# Altium footprint library PcbLib1.PcbLib: 120 footprints (part 6 of 8)
Each footprint in its own frame and in the unit in brackets; x right, y up, seen from the top. Pads: shape width x height; smd on the part's side, far side on the other; paste and mask are expansions set on the pad; w line width, h text height; cw(c..) or ccw(c..) is an arc to the next point about the centre after c.
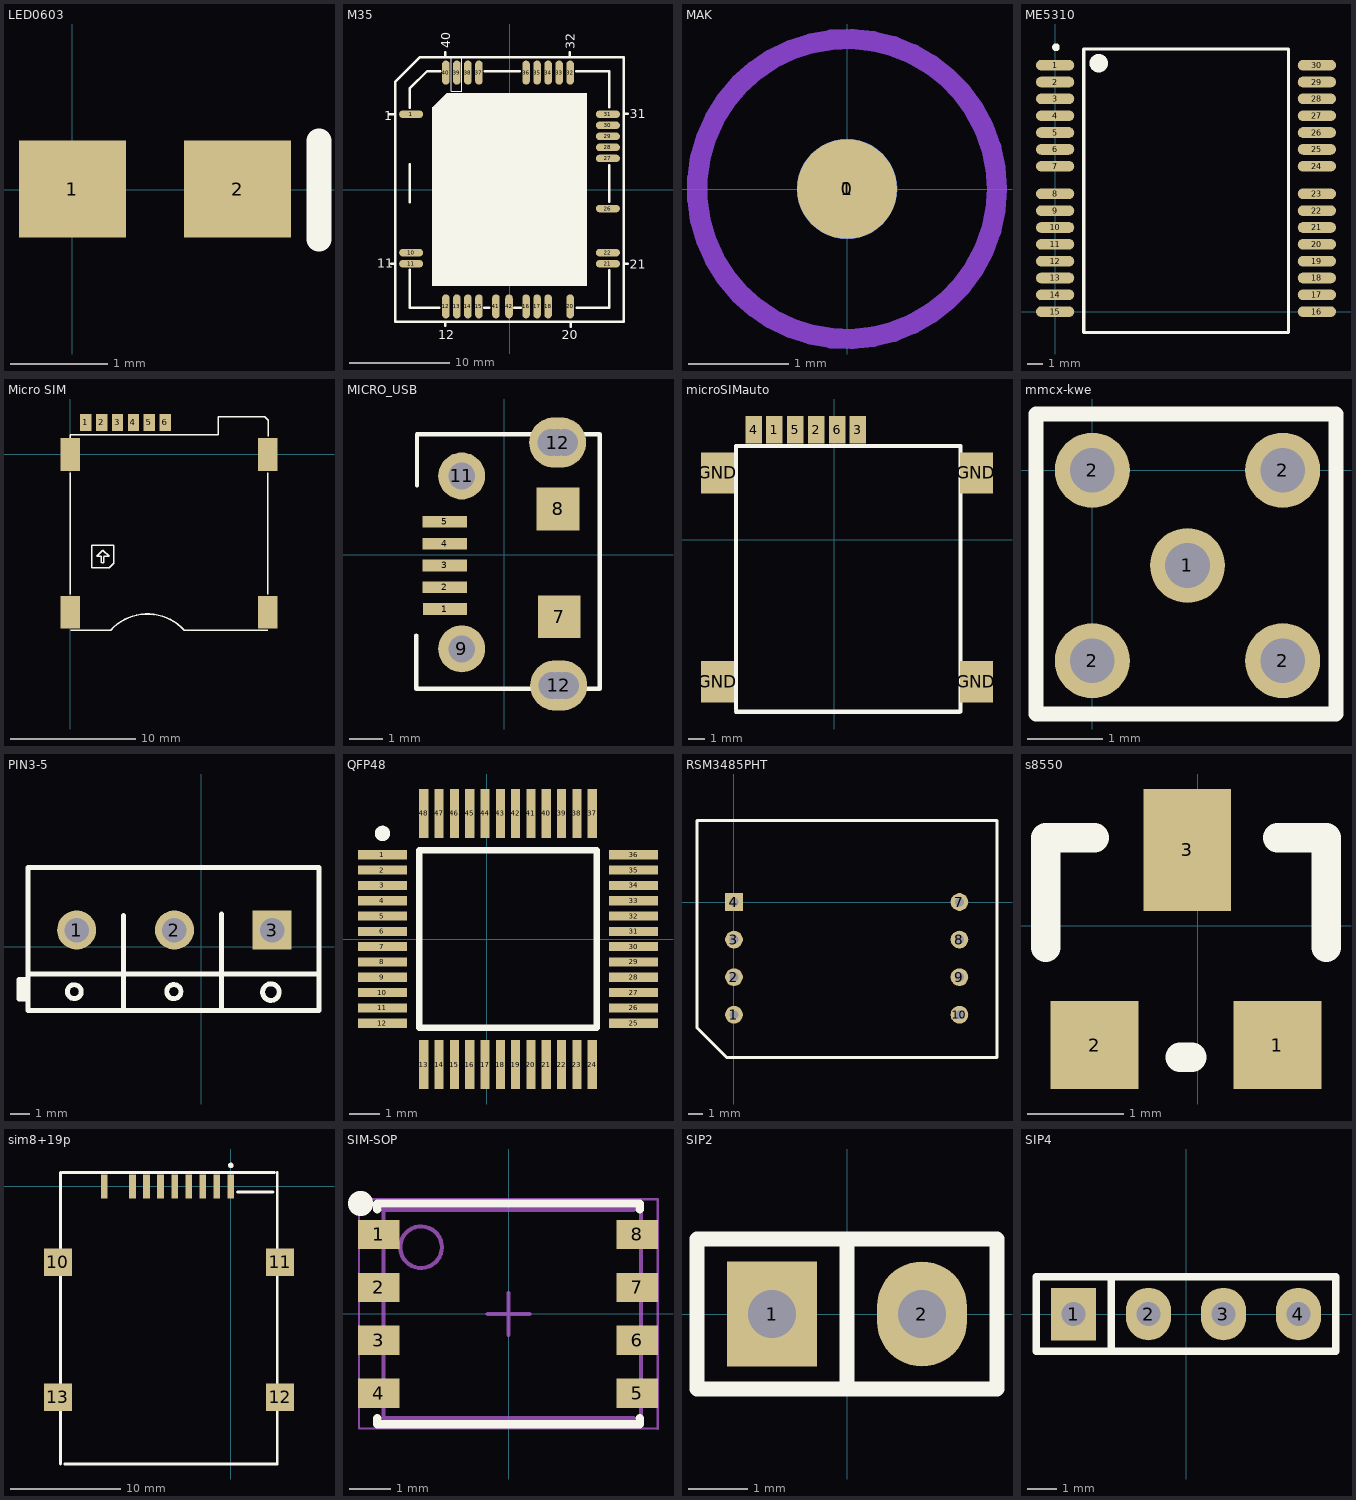
[diagram p5: the footprints below, top view; thin cyan lines are the x and y axes]

## LED0603 [mm]
height 2
pads (2):
  rect 1.1x1 smd: 1(0.001,0.01) 2(1.701,0.01)
Top Overlay:
  lines w0.254: 2.54,-0.508 2.54,0.508

## M35 [mm]
height 60
pads (43):
  oval 2.4x0.75 smd: 1(-9.8,7.5) 10(-9.8,-6.3) 11(-9.8,-7.4) 21(9.8,-7.4) 22(9.8,-6.3) 26(9.8,-1.9) 27(9.8,3.1) 28(9.8,4.2) 29(9.8,5.3) 30(9.8,6.4) 31(9.8,7.5)
  round 0 smd: 2(-9.8,6.4) 3(-9.8,5.3) 4(-9.8,4.2) 5(-9.8,3.1) 6(-9.8,-1.9) 7(-9.8,-3) 8(-9.8,-4.1) 9(-9.8,-5.2) 19(4.95,-11.65) 20(6.05,-11.65) 23(9.8,-5.2) 24(9.8,-4.1) 25(9.8,-3)
  oval 0.75x2.4 smd: 12(-6.35,-11.65) 13(-5.25,-11.65) 14(-4.15,-11.65) 15(-3.05,-11.65) 16(1.65,-11.65) 17(2.75,-11.65) 18(3.85,-11.65) 20(6.05,-11.65) 32(6.05,11.65) 33(4.95,11.65) 34(3.85,11.65) 35(2.75,11.65) 36(1.65,11.65) 37(-3.05,11.65) 38(-4.15,11.65) 39(-5.25,11.65) 40(-6.35,11.65) 41(-1.35,-11.65) 42(-0.05,-11.65)
Top Overlay:
  rectangle: -6.3,-9.6 7.7,9.6
  region: -6.291,6.775 -4.884,8.182 -6.299,9.596 -7.706,8.189
  rectangle: -7.7,-9.6 -6.2,8.2
  lines w0.1: -5.8,9.8 -4.75,9.8 -4.75,13.2 -5.8,13.2 -5.8,9.8
  lines w0.25: -12,7.5 -11.45,7.5
  lines w0.254: -11.8,-7.4 -11.45,-7.4 ; -11.4,-12.9 -11.4,10.7 -8.9,13.2 -3.1,13.2 ; -11.4,-12.7 -11.4,-13.2 11.4,-13.2 11.4,13.2 -3.3,13.2 ; -9.95,-8.025 -9.95,-11.8 -7,-11.8 ; -9.95,-1.275 -9.95,2.5 ; -9.95,8.15 -9.95,10.05 -8.2,11.8 ; -8.175,11.8 -6.9,11.8 ; -6.4,-13.6 -6.4,-13.2 ; -6.4,13.3 -6.4,13.7 ; -2.5,-11.8 -2,-11.8 ; -2.45,11.8 1,11.8 ; 0.5,-11.8 1.1,-11.8 ; 6,13.3 6,13.7 ; 6.1,-13.7 6.1,-13.25 ; 6.65,11.8 9.95,11.8 9.95,8.2 ; 6.7,-11.8 9.95,-11.8 9.95,-8.075 ; 9.95,-1.225 9.95,2.425 ; 11.472,7.536 11.772,7.536 ; 11.55,-7.4 11.8,-7.4
  text "20" at 5.2,-14.9 h0.9
  text "40" at -5.9,14.1 h0.9
  text "31" at 12,7.1 h0.9
  text "32" at 6.5,14 h0.9
  text "21" at 12,-7.9 h0.9
  text "1" at -12.5,6.9 h0.9
  text "11" at -13.2,-7.8 h0.9
  text "12" at -7.1,-14.9 h0.9

## MAK [mm]
height 0.1
pads (2):
  round 1 smd: 0(0,0)
  round 1 smd far side: 1(0,0)
Top Layer keep-out:
  circle w0.203: c0,0 r1.5
Bottom Layer keep-out:
  circle w0.203: c0,0 r1.5

## ME5310 [mm]
pads (30):
  oval 2.5x0.7 smd: 1(0,16.1) 2(0,15) 3(0,13.9) 4(0,12.8) 5(0,11.7) 6(0,10.6) 7(0,9.5) 8(0,7.7) 9(0,6.6) 10(0,5.5) 11(0,4.4) 12(0,3.3) 13(0,2.2) 14(0,1.1) 15(0,0) 16(17.1,0) 17(17.1,1.1) 18(17.1,2.2) 19(17.1,3.3) 20(17.1,4.4) 21(17.1,5.5) 22(17.1,6.6) 23(17.1,7.7) 24(17.1,9.5) 25(17.1,10.6) 26(17.1,11.7) 27(17.1,12.8) 28(17.1,13.9) 29(17.1,15) 30(17.1,16.1)
Top Overlay:
  circle w0.6: c2.845,16.231 r0.3
  circle w0.25: c0.051,17.272 r0.125
  lines w0.2: 1.87,-1.372 15.24,-1.372 15.24,17.17 1.87,17.17 1.87,-1.372

## Micro SIM [mm] "6P 自弹式"
pads (10):
  rect 0.9x1.34 smd: 1(1.24,2.565) 2(2.51,2.565) 3(3.78,2.565) 4(5.05,2.565) 5(6.32,2.565) 6(7.59,2.565)
  rect 1.56x2.61 smd: ""(0,-12.63) ""(0,0) ""(15.78,-12.63) ""(15.78,0)
Top Overlay:
  lines w0.1: 0,-11.176 0,-1.448 ; 0,1.346 0,1.575 1.723,1.575 11.832,1.575 11.832,2.769 11.832,2.993 11.857,3.018 15.54,3.018 15.82,2.739 15.82,2.515 15.82,1.448 ; 0.046,-14.064 3.225,-14.064 ; 2.095,-8.141 2.591,-7.645 3.099,-8.153 2.692,-8.153 ; 2.108,-8.153 2.489,-8.153 2.489,-8.661 ; 2.515,-8.661 2.692,-8.661 2.692,-8.179 ; 3.454,-8.585 3.454,-7.239 1.727,-7.239 1.727,-9.068 3.099,-9.068 3.454,-8.712 3.454,-8.357 ; 9.113,-14.046 15.799,-14.046 ; 15.799,-11.176 15.799,-1.473
  lines w0.14: 3.225,-14.041 cw(c6.167,-16.751) 9.113,-14.046

## MICRO_USB [mm]
pads (11):
  rect 1.32x0.35 smd: 1(-1.772,-1.627) 2(-1.781,-0.977) 3(-1.781,-0.327) 4(-1.781,0.323) 5(-1.781,0.973)
  rect 1.27x1.27 smd: 7(1.631,-1.855) 8(1.598,1.358)
  round 1.4 hole 0.8: 9(-1.273,-2.812) 11(-1.273,2.34)
  oval 1.7x1.5 hole 0.8: 12(1.585,3.337) 12(1.617,-3.902)
via 1.786,3.334 diameter 0.9 hole 0.8
via 1.586,3.334 diameter 0.9 hole 0.8
via 1.386,3.334 diameter 0.9 hole 0.8
via 1.418,-3.905 diameter 0.9 hole 0.8
via 1.618,-3.905 diameter 0.9 hole 0.8
via 1.818,-3.905 diameter 0.9 hole 0.8
Top Overlay:
  lines w0.127: -2.627,-2.41 -2.627,-3.997 2.842,-3.997 2.842,3.58 -2.606,3.58 -2.606,2.056

## microSIMauto [mm]
pads (10):
  rect 1x1.65 smd: 1(-3.651,6.689) 2(-1.111,6.689) 3(1.429,6.689) 4(-4.921,6.689) 5(-2.381,6.689) 6(0.159,6.689)
  rect 2x2.5 smd: GND(-7.112,-8.636) GND(-7.112,4.064) GND(8.636,-8.636) GND(8.636,4.064)
Top Overlay:
  lines w0.254: -5.998,-10.325 -5.998,5.705 7.66,5.705 ; -5.991,-10.465 7.614,-10.465 ; 7.672,-10.449 7.672,5.692

## mmcx-kwe [mm] "mmcx-kwe"
height 3
pads (5):
  round 1 hole 0.6: 1(1.27,-1.27) 2(0,-2.54) 2(0,0) 2(2.54,-2.54) 2(2.54,0)
Top Overlay:
  lines w0.2: -0.75,-3.25 -0.75,0.75 3.25,0.75 3.25,-3.25 -0.75,-3.25

## PIN3-5 [mil]
pads (3):
  round 80 hole 50: 1(-254.86,34.44) 2(-54.86,34.44)
  rect 80x80 hole 50: 3(145.14,34.44)
Top Overlay:
  circle w10: c-259.78,-91.51 r14.19
  circle w10: c-56.09,-91.51 r14.53
  circle w10: c142.68,-92.5 r16.99
  lines w10: -364.08,-72.82 -364.08,-106.27 -354.24,-106.27 -372.94,-106.27 -372.94,-66.91 -354.24,-66.91 ; -354.24,-55.1 241.08,-55.1 241.08,-68.88 ; -159.41,-129.89 -159.41,63.96 ; 41.33,-129.89 41.33,-43.3 ; 41.33,-55.1 41.33,67.9 ; -354.24,-129.89 -354.24,107.26 -354.24,162.36 241.08,162.36 241.08,-129.89 -354.24,-129.89

## QFP48 [mm]
pads (48):
  rect 1.6x0.3 smd: 1(-3.401,2.765) 2(-3.401,2.265) 3(-3.401,1.765) 4(-3.401,1.265) 5(-3.401,0.765) 6(-3.401,0.265) 7(-3.401,-0.235) 8(-3.401,-0.735) 9(-3.401,-1.235) 10(-3.401,-1.735) 11(-3.401,-2.235) 12(-3.401,-2.735) 25(4.799,-2.735) 26(4.799,-2.235) 27(4.799,-1.735) 28(4.799,-1.235) 29(4.799,-0.735) 30(4.799,-0.235) 31(4.799,0.265) 32(4.799,0.765) 33(4.799,1.265) 34(4.799,1.765) 35(4.799,2.265) 36(4.799,2.765)
  rect 0.3x1.6 smd: 13(-2.051,-4.085) 14(-1.551,-4.085) 15(-1.051,-4.085) 16(-0.551,-4.085) 17(-0.051,-4.085) 18(0.449,-4.085) 19(0.949,-4.085) 20(1.449,-4.085) 21(1.949,-4.085) 22(2.449,-4.085) 23(2.949,-4.085) 24(3.449,-4.085) 37(3.449,4.115) 38(2.949,4.115) 39(2.449,4.115) 40(1.949,4.115) 41(1.449,4.115) 42(0.949,4.115) 43(0.449,4.115) 44(-0.051,4.115) 45(-0.551,4.115) 46(-1.051,4.115) 47(-1.551,4.115) 48(-2.051,4.115)
Top Overlay:
  circle w0.25: c-3.401,3.465 r0.125
  lines w0.2: -2.201,-2.885 3.599,-2.885 3.599,2.915 -2.201,2.915 -2.201,-2.885

## RSM3485PHT [mm]
pads (8):
  round 1.2 hole 0.6: 1(0,-7.62) 2(0,-5.08) 3(0,-2.54) 7(15.24,0) 8(15.24,-2.54) 9(15.24,-5.08) 10(15.24,-7.62)
  rect 1.2x1.2 hole 0.6: 4(0,0)
Top Overlay:
  lines w0.2: -2.5,-8.5 -0.5,-10.5 17.78,-10.5 17.78,5.5 -2.5,5.5 -2.5,-8.5

## s8550 [mil]
pads (3):
  rect 36x36 smd: 1(32.66,-48.93) 2(-42.34,-48.93)
  rect 36x50 smd: 3(-4.34,31.07)
Top Overlay:
  lines w12: -62.34,-8.93 -62.34,36.07 -42.34,36.07 ; -7.34,-53.93 -2.34,-53.93 ; 32.66,36.07 52.66,36.07 52.66,-8.93

## sim8+19p [mm] "C"
height 2
pads (13):
  rect 0.6x2.2 smd: 1(0,0) 2(-2.54,0) 3(-5.08,0) 4(-7.62,0) 5(-1.27,0) 6(-3.81,0) 7(-6.35,0) 8(-8.89,0) 9(-11.43,0)
  rect 2.5x2.5 smd: 10(-15.621,-6.858) 11(4.445,-6.858) 12(4.445,-19.05) 13(-15.621,-19.05)
Top Overlay:
  circle w0.25: c0.002,1.905 r0.125
  lines w0.254: -15.39,-25.08 -15.39,1.27 ; -15.263,1.27 3.937,1.27 ; -15.009,-25.08 4.191,-25.08 4.191,1.27 ; 0.61,-0.508 3.81,-0.508

## SIM-SOP [mm]
pads (8):
  rect 1x0.7 smd: 1(-3.113,1.905) 2(-3.113,0.635) 3(-3.113,-0.635) 4(-3.113,-1.905) 5(3.088,-1.905) 6(3.088,-0.635) 7(3.088,0.635) 8(3.088,1.905)
Top Overlay:
  circle w0.5: c-3.55,2.65 r0.05
  lines w0.2: -3.15,-2.505 -3.15,-2.65 3.15,-2.65 3.15,-2.505 ; -3.15,2.505 -3.15,2.65 3.15,2.65 3.15,2.505
Mechanical 13:
  circle w0.1: c-2.1,1.6 r0.5
  lines w0.1: 3,-2.5 -3,-2.5 -3,2.5 3,2.5 ; 3.178,-2.5 3.178,2.5
Mechanical 15:
  lines w0.05: 3.581,-2.757 3.581,2.743 ; 3.585,-2.75 -3.585,-2.75 -3.585,2.75 3.585,2.75
  lines w0.1: -0.5,0 0.5,0 ; 0,-0.5 0,0.5
3D body: height 2.65, standoff 0.1, extent -2.822,-2.5 3.178,2.5

## SIP2 [mil]
pads (2):
  rect 60x70 hole 32: 1(-50,0)
  oval 60x70 hole 32: 2(50,0)
Top Overlay:
  lines w10: 0,-50 0,50 ; -100,-50 -100,50 100,50 100,-50 -100,-50

## SIP4 [mil]
pads (4):
  rect 60x70 hole 32: 1(-150,0)
  oval 60x70 hole 32: 2(-50,0) 3(50,0) 4(150,0)
Top Overlay:
  lines w10: -100,-50 -100,50 ; -200,-50 200,-50 200,50 -200,50 -200,-50